# Altium footprint library connecteurs.PcbLib: 162 footprints (part 10 of 11)
Each footprint in its own frame and in the unit in brackets; x right, y up, seen from the top. Pads: shape width x height; smd on the part's side, far side on the other; paste and mask are expansions set on the pad; w line width, h text height; cw(c..) or ccw(c..) is an arc to the next point about the centre after c.
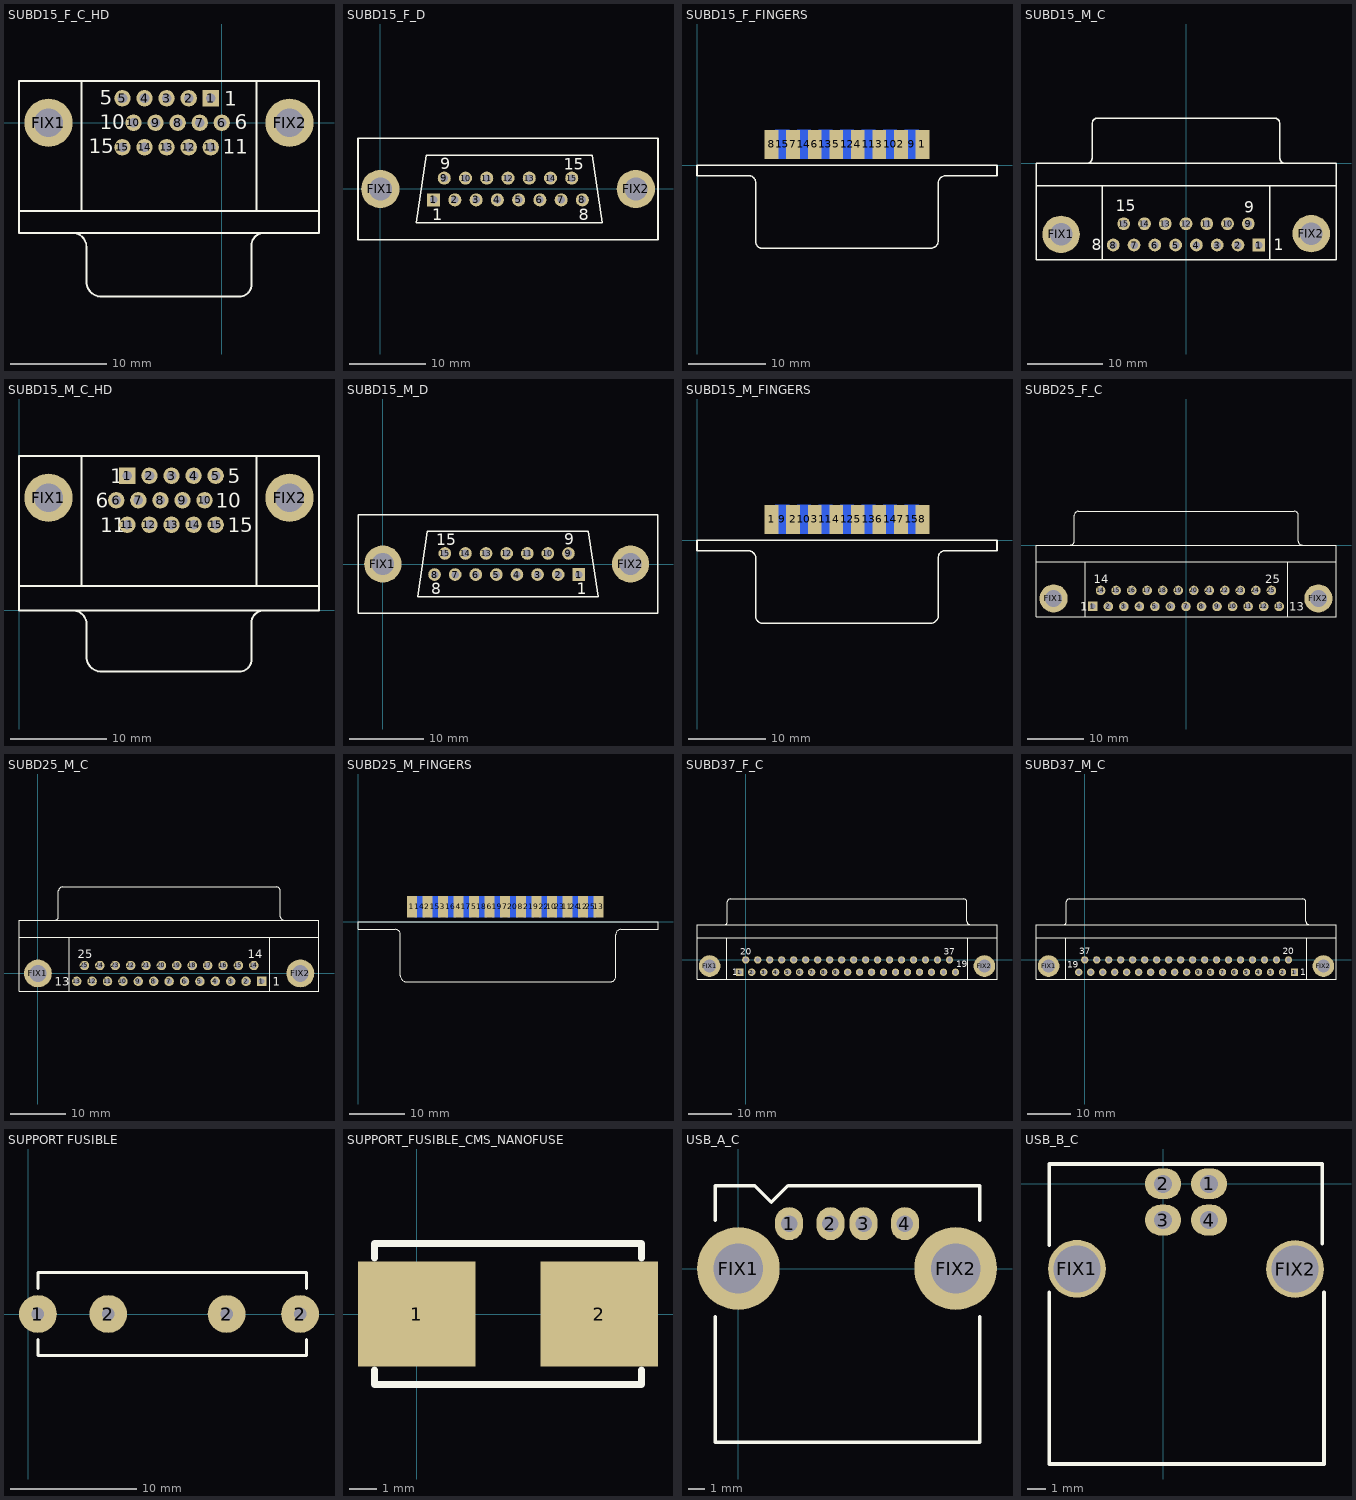
[diagram p9: the footprints below, top view; thin cyan lines are the x and y axes]

## SUBD15_F_C_HD [mm] "SUBD ; 15 CONTACTS ; FEMELLE ; COUDE ; HAUTE DENSITE ; PAS = 2.29 mm / 2.54 mm"
height 12.6
pads (17):
  rect 1.7x1.7 hole 1: 1(-1.145,2.54)
  round 1.7 hole 1: 2(-3.435,2.54) 3(-5.725,2.54) 4(-8.015,2.54) 5(-10.305,2.54) 6(0,0) 7(-2.29,0) 8(-4.58,0) 9(-6.87,0) 10(-9.16,0) 11(-1.145,-2.54) 12(-3.435,-2.54) 13(-5.725,-2.54) 14(-8.015,-2.54) 15(-10.305,-2.54)
  round 5 hole 3: FIX1(-17.975,0) FIX2(7.025,0)
Top Overlay:
  lines w0.2: -21.035,-9.154 10.085,-9.154 ; -15.493,-11.436 cw(c-15.478,-12.874) -14.04,-12.86 ; -14.535,-9.154 -14.535,4.306 ; -14.035,-16.52 -14.035,-12.87 ; -14.035,-16.266 ccw(c-12.455,-16.464) -12.653,-18.044 1.825,-18.044 ccw(c1.82,-16.779) 3.085,-16.774 3.085,-12.72 ; 3.09,-12.71 cw(c4.365,-12.715) 4.37,-11.44 ; 3.585,-9.154 3.585,4.306 ; 3.989,-11.43 10.019,-11.43 ; 4.283,-11.43 -15.275,-11.43 -21.035,-11.43 -21.035,4.306 10.085,4.306 10.085,-11.43
  text "6" at 1.37,-0.69 h1.5
  text "11" at 0.12,-3.22 h1.5
  text "15" at -13.81,-3.18 h1.5
  text "10" at -12.65,-0.67 h1.5
  text "5" at -12.67,1.89 h1.5
  text "1" at 0.24,1.75 h1.5

## SUBD15_F_D [mm] "SUBD ; 15 CONTACTS ; FEMELLE ; DROITE ; PAS = 2.77 mm / 2.8 mm"
height 12.75
pads (17):
  rect 1.7x1.7 hole 1: 1(6.955,-1.42)
  round 1.7 hole 1: 2(9.725,-1.42) 3(12.495,-1.42) 4(15.265,-1.42) 5(18.035,-1.42) 6(20.805,-1.42) 7(23.575,-1.42) 8(26.345,-1.42) 9(8.34,1.42) 10(11.11,1.42) 11(13.88,1.42) 12(16.65,1.42) 13(19.42,1.42) 14(22.19,1.42) 15(24.96,1.42)
  round 5 hole 3: FIX1(0,0) FIX2(33.31,0)
Top Overlay:
  lines w0.2: -2.905,-6.6 36.2,-6.6 36.2,6.6 -2.905,6.6 -2.905,-6.6 ; 4.695,-4.4 5.995,4.4 27.654,4.4 28.954,-4.4 4.695,-4.4
  text "15" at 23.94,2.52 h1.5
  text "9" at 7.795,2.6 h1.5
  text "1" at 6.8,-4.1 h1.5
  text "8" at 25.84,-4.08 h1.5
3D body: height 12.3, standoff -3.42, extent -3.4,-6.5 36.6,6.5

## SUBD15_F_FINGERS [mm] "SUBD ; 15 CONTACTS ; FEMELLE ; DROIT ; MONTAGE BORD DE CARTE ; PAS = 2.8mm"
height 6.2
pads (15):
  rect 1.8x3.8 smd: 1(29.3,2.7) 2(26.5,2.7) 3(23.7,2.7) 4(20.9,2.7) 5(18.1,2.7) 6(15.3,2.7) 7(12.5,2.7) 8(9.7,2.7)
  rect 1.8x3.8 smd far side: 9(27.9,2.7) 10(25.1,2.7) 11(22.3,2.7) 12(19.5,2.7) 13(16.7,2.7) 14(13.9,2.7) 15(11.1,2.7)
Top Overlay:
  lines w0.2: 32.29,-1.38 39,-1.38 39,0 0,0 0,-1.38 6.7,-1.38 cw(c6.755,-2.255) 7.63,-2.31 7.63,-10 ccw(c8.465,-9.965) 8.5,-10.8 30.4,-10.8 ccw(c30.385,-9.815) 31.37,-9.8 31.37,-2.3 cw(c32.295,-2.305) 32.3,-1.38

## SUBD15_M_C [mm] "SUBD ; 15 CONTACTS ; MALE ; COUDE ; PAS = 2.77 mm / 2.8 mm"
height 12.6
pads (17):
  rect 1.7x1.7 hole 1: 1(9.695,-10.92)
  round 1.7 hole 1: 2(6.925,-10.92) 3(4.155,-10.92) 4(1.385,-10.92) 5(-1.385,-10.92) 6(-4.155,-10.92) 7(-6.925,-10.92) 8(-9.695,-10.92) 9(8.31,-8.08) 10(5.54,-8.08) 11(2.77,-8.08) 12(0,-8.08) 13(-2.77,-8.08) 14(-5.54,-8.08) 15(-8.31,-8.08)
  round 5 hole 3: FIX1(-16.66,-9.5) FIX2(16.7,-9.4)
Top Overlay:
  lines w0.2: -20,-3 20,-3 ; -13.195,0.005 ccw(c-13.195,0.7) -12.5,0.7 -12.5,5.3 ; -12.495,5.305 cw(c-11.8,5.305) -11.8,6 11.8,6 cw(c11.8,5.305) 12.495,5.305 ; -11.14,-12.89 -11.14,-3 ; 11.14,-12.9 11.14,-3 ; 12.5,5.3 12.5,0.7 ccw(c13.195,0.7) 13.195,0.005 ; -20,-12.9 20,-12.9 20,0 -20,0 -20,-12.9
  text "15" at -9.4,-6.4 h1.5
  text "9" at 7.8,-6.6 h1.5
  text "1" at 11.7,-11.6 h1.5
  text "8" at -12.6,-11.6 h1.5
3D body: height 12.55, standoff -3.5, extent -19.81,-12.7 19.81,6.1

## SUBD15_M_C_HD [mm] "SUBD ; 15 CONTACTS ; MALE ; COUDE ; HAUTE DENSITE ; PAS = 2.29 mm / 2.54 mm"
height 12.6
pads (17):
  rect 1.7x1.7 hole 1: 1(11.24,13.97)
  round 1.7 hole 1: 2(13.53,13.97) 3(15.82,13.97) 4(18.11,13.97) 5(20.4,13.97) 6(10.09,11.43) 7(12.38,11.43) 8(14.67,11.43) 9(16.96,11.43) 10(19.25,11.43) 11(11.24,8.89) 12(13.53,8.89) 13(15.82,8.89) 14(18.11,8.89) 15(20.4,8.89)
  round 5 hole 3: FIX1(3.06,11.694) FIX2(28.06,11.694)
Top Overlay:
  lines w0.2: 0,2.54 31.12,2.54 ; 6.5,2.54 6.5,16 ; 7,-4.826 7,-1.58 ccw(c5.57,-1.43) 5.72,0 ; 7,-4.572 ccw(c8.58,-4.77) 8.382,-6.35 22.86,-6.35 ccw(c22.855,-5.085) 24.12,-5.08 24.12,-1.27 cw(c25.395,-1.275) 25.4,0 ; 24.62,2.54 24.62,16 ; 25.024,0 31.054,0 ; 25.278,0 5.72,0 ; 31.12,0 31.12,16 0,16 0,0 5.72,0
  text "6" at 7.938,10.668 h1.5
  text "1" at 9.462,13.208 h1.5
  text "5" at 21.654,13.208 h1.5
  text "10" at 20.384,10.668 h1.5
  text "15" at 21.654,8.128 h1.5
  text "11" at 8.446,8.128 h1.5

## SUBD15_M_D [mm] "SUBD ; 15 CONTACTS ; MALE ; PAS = 2.77 mm / 2.8 mm"
height 12.75
pads (17):
  rect 1.7x1.7 hole 1: 1(26.345,-1.42)
  round 1.7 hole 1: 2(23.575,-1.42) 3(20.805,-1.42) 4(18.035,-1.42) 5(15.265,-1.42) 6(12.495,-1.42) 7(9.725,-1.42) 8(6.955,-1.42) 9(24.96,1.42) 10(22.19,1.42) 11(19.42,1.42) 12(16.65,1.42) 13(13.88,1.42) 14(11.11,1.42) 15(8.34,1.42)
  round 5 hole 3: FIX1(0,0) FIX2(33.31,0)
Top Overlay:
  lines w0.2: -3.34,-6.64 -3.34,6.64 37,6.64 37,-6.64 -3.34,-6.64 ; 4.695,-4.4 28.954,-4.4 27.654,4.4 5.995,4.4 4.695,-4.4
  text "1" at 26.1,-4.1 h1.5
  text "8" at 6.5,-4.1 h1.5
  text "15" at 7.2,2.5 h1.5
  text "9" at 24.4,2.6 h1.5
3D body: height 12.37, standoff -3.49, extent -3.2,-6.5 36.8,6.5

## SUBD15_M_FINGERS [mm] "SUBD ; 15 CONTACTS ; MALE ; DROIT ; MONTAGE BORD DE CARTE ; PAS = 2.8 mm"
height 6.2
pads (15):
  rect 1.8x3.8 smd: 1(9.7,2.7) 2(12.5,2.7) 3(15.3,2.7) 4(18.1,2.7) 5(20.9,2.7) 6(23.7,2.7) 7(26.5,2.7) 8(29.3,2.7)
  rect 1.8x3.8 smd far side: 9(11.1,2.7) 10(13.9,2.7) 11(16.7,2.7) 12(19.5,2.7) 13(22.3,2.7) 14(25.1,2.7) 15(27.9,2.7)
Top Overlay:
  lines w0.2: 6.6,-1.38 cw(c6.655,-2.355) 7.63,-2.3 ; 6.68,-1.38 0,-1.38 0,0 39,0 39,-1.38 32.2,-1.38 ccw(c32.245,-2.255) 31.37,-2.3 31.37,-9.7 cw(c30.335,-9.765) 30.4,-10.8 8.5,-10.8 cw(c8.565,-9.865) 7.63,-9.8 7.63,-2.33

## SUBD25_F_C [mm] "SUBD ; 25 CONTACTS ; FEMELLE ; COUDE ; PAS = 2.77 mm / 2.8 mm"
height 12.93
pads (27):
  rect 1.7x1.7 hole 1: 1(-16.566,-10.92)
  round 1.7 hole 1: 2(-13.805,-10.92) 3(-11.044,-10.92) 4(-8.283,-10.92) 5(-5.522,-10.92) 6(-2.761,-10.92) 7(0,-10.92) 8(2.761,-10.92) 9(5.522,-10.92) 10(8.283,-10.92) 11(11.044,-10.92) 12(13.805,-10.92) 13(16.566,-10.92) 14(-15.185,-8.08) 15(-12.424,-8.08) 16(-9.663,-8.08) 17(-6.902,-8.08) 18(-4.141,-8.08) 19(-1.38,-8.08) 20(1.381,-8.08) 21(4.142,-8.08) 22(6.903,-8.08) 23(9.664,-8.08) 24(12.425,-8.08) 25(15.186,-8.08)
  round 5 hole 3: FIX1(-23.526,-9.5) FIX2(23.526,-9.5)
Top Overlay:
  lines w0.2: -26.496,-3 26.604,-3 ; -20.541,0.005 ccw(c-20.541,0.7) -19.846,0.7 -19.846,5.3 ; -19.841,5.305 cw(c-19.146,5.305) -19.146,6 19.254,6 cw(c19.254,5.305) 19.949,5.305 ; -17.946,-12.74 -17.946,-3 ; 18.054,-12.75 18.054,-3 ; 19.954,5.3 19.954,0.7 ccw(c20.649,0.7) 20.649,0.005 ; -26.67,-12.75 -26.67,0 26.67,0 26.67,-12.75 -26.67,-12.75
  text "25" at 14.1,-6.8 h1.5
  text "14" at -16.4,-6.8 h1.5
  text "13" at 18.4,-11.7 h1.5
  text "1" at -18.8,-11.7 h1.5
3D body: height 12.57, standoff -4.57, extent -26.52,-12.6 26.52,7.9

## SUBD25_M_C [mm] "SUBD ; 25 CONTACTS ; MALE ; COUDE ; PAS = 2.77 mm / 2.8 mm"
height 12.93
pads (27):
  rect 1.7x1.7 hole 1: 1(40.092,-1.42)
  round 1.7 hole 1: 2(37.331,-1.42) 3(34.57,-1.42) 4(31.809,-1.42) 5(29.048,-1.42) 6(26.287,-1.42) 7(23.526,-1.42) 8(20.765,-1.42) 9(18.004,-1.42) 10(15.243,-1.42) 11(12.482,-1.42) 12(9.721,-1.42) 13(6.96,-1.42) 14(38.711,1.42) 15(35.95,1.42) 16(33.189,1.42) 17(30.428,1.42) 18(27.667,1.42) 19(24.906,1.42) 20(22.145,1.42) 21(19.384,1.42) 22(16.623,1.42) 23(13.862,1.42) 24(11.101,1.42) 25(8.34,1.42)
  round 5 hole 3: FIX1(0,0) FIX2(47.052,0)
Top Overlay:
  lines w0.2: -3.39,6.5 50.37,6.5 ; 2.985,9.505 ccw(c2.985,10.2) 3.68,10.2 3.68,14.8 ; 3.685,14.805 cw(c4.38,14.805) 4.38,15.5 42.78,15.5 cw(c42.78,14.805) 43.475,14.805 ; 5.58,-3.14 5.58,6.5 ; 41.58,-3.14 41.58,6.5 ; 43.48,14.8 43.48,10.2 ccw(c44.175,10.2) 44.175,9.505 ; -3.39,-3.16 -3.39,9.5 50.4,9.5 50.4,-3.16 -3.39,-3.16
  text "14" at 37.626,2.7 h1.5
  text "25" at 7.126,2.7 h1.5
  text "1" at 42.126,-2.2 h1.5
  text "13" at 3.026,-2.2 h1.5
3D body: height 12.7, standoff -4.5, extent -3.235,-3 50.235,15.4

## SUBD25_M_FINGERS [mm] "SUBD ; 25 CONTACTS ; MALE ; DROIT; MONTAGE BORD DE CARTE ; PAS = 2.8 mm"
height 6.2
pads (25):
  rect 1.8x3.8 smd: 1(9.7,2.7) 2(12.5,2.7) 3(15.3,2.7) 4(18.1,2.7) 5(20.9,2.7) 6(23.7,2.7) 7(26.5,2.7) 8(29.3,2.7) 9(32.1,2.7) 10(34.9,2.7) 11(37.7,2.7) 12(40.5,2.7) 13(43.3,2.7)
  rect 1.8x3.8 smd far side: 14(11.1,2.7) 15(13.9,2.7) 16(16.7,2.7) 17(19.5,2.7) 18(22.3,2.7) 19(25.1,2.7) 20(27.9,2.7) 21(30.7,2.7) 22(33.5,2.7) 23(36.3,2.7) 24(39.1,2.7) 25(41.9,2.7)
Top Overlay:
  lines w0.2: 0,-1.38 0,0 54,0 54,-1.38 47.3,-1.38 ccw(c47.31,-2.29) 46.4,-2.3 46.4,-9.8 cw(c45.45,-9.85) 45.5,-10.8 8.8,-10.8 cw(c8.765,-9.665) 7.63,-9.7 7.63,-2.296 ccw(c6.714,-2.296) 6.714,-1.38 0,-1.38

## SUBD37_F_C [mm] "SUBD ; 37 CONTACTS ; FEMELLE ; COUDE ; PAS = 2.77 mm / 2.8 mm"
height 12.93
pads (39):
  rect 1.7x1.7 hole 1: 1(-1.385,-2.84)
  round 1.7 hole 1: 2(1.385,-2.84) 3(4.155,-2.84) 4(6.925,-2.84) 5(9.695,-2.84) 6(12.465,-2.84) 7(15.235,-2.84) 8(18.005,-2.84) 9(20.775,-2.84) 10(23.545,-2.84) 11(26.315,-2.84) 12(29.085,-2.84) 13(31.855,-2.84) 14(34.625,-2.84) 15(37.395,-2.84) 16(40.165,-2.84) 17(42.935,-2.84) 18(45.705,-2.84) 19(48.475,-2.84) 20(0,0) 21(2.77,0) 22(5.54,0) 23(8.31,0) 24(11.08,0) 25(13.85,0) 26(16.62,0) 27(19.39,0) 28(22.16,0) 29(24.93,0) 30(27.7,0) 31(30.47,0) 32(33.24,0) 33(36.01,0) 34(38.78,0) 35(41.55,0) 36(44.32,0) 37(47.09,0)
  round 5 hole 3: FIX1(-8.345,-1.42) FIX2(55.155,-1.42)
Top Overlay:
  lines w0.2: -11.255,5.08 58.065,5.08 ; -4.98,8.085 ccw(c-4.98,8.78) -4.285,8.78 -4.285,13.38 ; -4.435,-4.42 -4.435,5.08 ; -4.28,13.385 cw(c-3.585,13.385) -3.585,14.08 50.4,14.08 cw(c50.4,13.385) 51.095,13.385 ; 51.1,13.5 51.1,8.9 ccw(c51.795,8.9) 51.795,8.205 ; 51.265,-4.42 51.265,5.08 ; -11.255,-4.42 -11.255,8.08 58.065,8.08 58.065,-4.42 -11.255,-4.42
  text "37" at 45.8,1.2 h1.5
  text "20" at -1.3,1.2 h1.5
  text "19" at 48.7,-1.7 h1.5
  text "1" at -3.1,-3.6 h1.5
3D body: height 12.51, standoff -4.23, extent -11.134,-3.2 58.334,14.682

## SUBD37_M_C [mm] "SUBD ; 37 CONTACTS ; MALE ; COUDE ; PAS = 2.77 mm / 2.8 mm"
height 12.93
pads (39):
  rect 1.7x1.7 hole 1: 1(48.475,-2.84)
  round 1.7 hole 1: 2(45.705,-2.84) 3(42.935,-2.84) 4(40.165,-2.84) 5(37.395,-2.84) 6(34.625,-2.84) 7(31.855,-2.84) 8(29.085,-2.84) 9(26.315,-2.84) 10(23.545,-2.84) 11(20.775,-2.84) 12(18.005,-2.84) 13(15.235,-2.84) 14(12.465,-2.84) 15(9.695,-2.84) 16(6.925,-2.84) 17(4.155,-2.84) 18(1.385,-2.84) 19(-1.385,-2.84) 20(47.09,0) 21(44.32,0) 22(41.55,0) 23(38.78,0) 24(36.01,0) 25(33.24,0) 26(30.47,0) 27(27.7,0) 28(24.93,0) 29(22.16,0) 30(19.39,0) 31(16.62,0) 32(13.85,0) 33(11.08,0) 34(8.31,0) 35(5.54,0) 36(2.77,0) 37(0,0)
  round 5 hole 3: FIX1(-8.345,-1.42) FIX2(55.155,-1.42)
Top Overlay:
  lines w0.2: -11.255,5.08 58.065,5.08 ; -4.98,8.085 ccw(c-4.98,8.78) -4.285,8.78 -4.285,13.38 ; -4.435,-4.42 -4.435,5.08 ; -4.28,13.385 cw(c-3.585,13.385) -3.585,14.08 50.4,14.08 cw(c50.4,13.385) 51.095,13.385 ; 51.1,13.5 51.1,8.9 ccw(c51.795,8.9) 51.795,8.205 ; 51.265,-4.42 51.265,5.08 ; -11.255,-4.42 58.065,-4.42 58.065,8.08 -11.255,8.08 -11.255,-4.42
  text "19" at -4,-1.8 h1.5
  text "1" at 49.8,-3.5 h1.5
  text "37" at -1.3,1.3 h1.5
  text "20" at 45.8,1.3 h1.5

## SUPPORT FUSIBLE [mm] "Base Mount Fuseholder; For 5mm/20mm fuses."
height 15
pads (4):
  round 3 hole 1: 1(0.762,0) 2(6.35,0) 2(15.748,0) 2(21.59,0)
Top Overlay:
  lines w0.254: 0.762,-2.032 0.762,-3.302 22.098,-3.302 22.098,-2.032 ; 0.762,2.032 0.762,3.302 22.098,3.302 22.098,2.032
3D body: height 9.59, standoff -3.31, extent 0.508,-3.095 21.786,3.095

## SUPPORT_FUSIBLE_CMS_NANOFUSE [mm] "SMF,Omni blok Fuse blok"
height 3.81
pads (2):
  rect 4.24x3.81 smd: 1(0,0) 2(6.604,0)
Top Overlay:
  lines w0.254: -1.524,-2.032 -1.524,-2.54 8.128,-2.54 8.128,-2.032 ; -1.524,2.032 -1.524,2.54 8.128,2.54 8.128,2.032
3D body: height 3.81, standoff 0, extent -1.613,-2.54 8.217,2.49

## USB_A_C [mm] "USB ; TYPE A ; COUDE ; PAS = 2 mm / 2.5 mm & 13.14 mm"
height 10.2
pads (6):
  oval 1.7x2 hole 1: 1(3.07,2.71) 2(5.57,2.71) 3(7.57,2.71) 4(10.07,2.71)
  round 5 hole 3: FIX1(0,0) FIX2(13.14,0)
Top Overlay:
  lines w0.2: -1.4,-2.9 -1.4,-10.5 14.6,-10.5 14.6,-2.9 ; -1.4,2.9 -1.4,5 1,5 2,4 ; 14.6,2.9 14.6,5 3,5 2,4 ; 2,4 2,4
3D body: height 2.9, standoff -7.95, extent -1.31,-10.42 14.49,3.74

## USB_B_C [mm] "USB ; TYPE B ; 4 CONTACTS ; COUDE ;  PAS = 2 mm / 2.54 mm & 12.07 mm"
height 12
pads (6):
  oval 2x1.7 hole 1: 1(2.54,0) 2(0,0) 3(0,-2) 4(2.54,-2)
  round 3.2 hole 2.6: FIX1(-4.77,-4.7) FIX2(7.3,-4.71)
Top Overlay:
  lines w0.2: -6.3,-6 -6.3,-15.5 8.9,-15.5 8.9,-6 ; -6.3,-3.4 -6.3,1.1 8.8,1.1 8.8,-3.3
3D body: height 3.27, standoff -10.95, extent -6.179,-15.49 8.679,0.81